# Altium footprint library kalios.PcbLib: 404 footprints (part 4 of 26)
Each footprint in its own frame and in the unit in brackets; x right, y up, seen from the top. Pads: shape width x height; smd on the part's side, far side on the other; paste and mask are expansions set on the pad; w line width, h text height; cw(c..) or ccw(c..) is an arc to the next point about the centre after c.
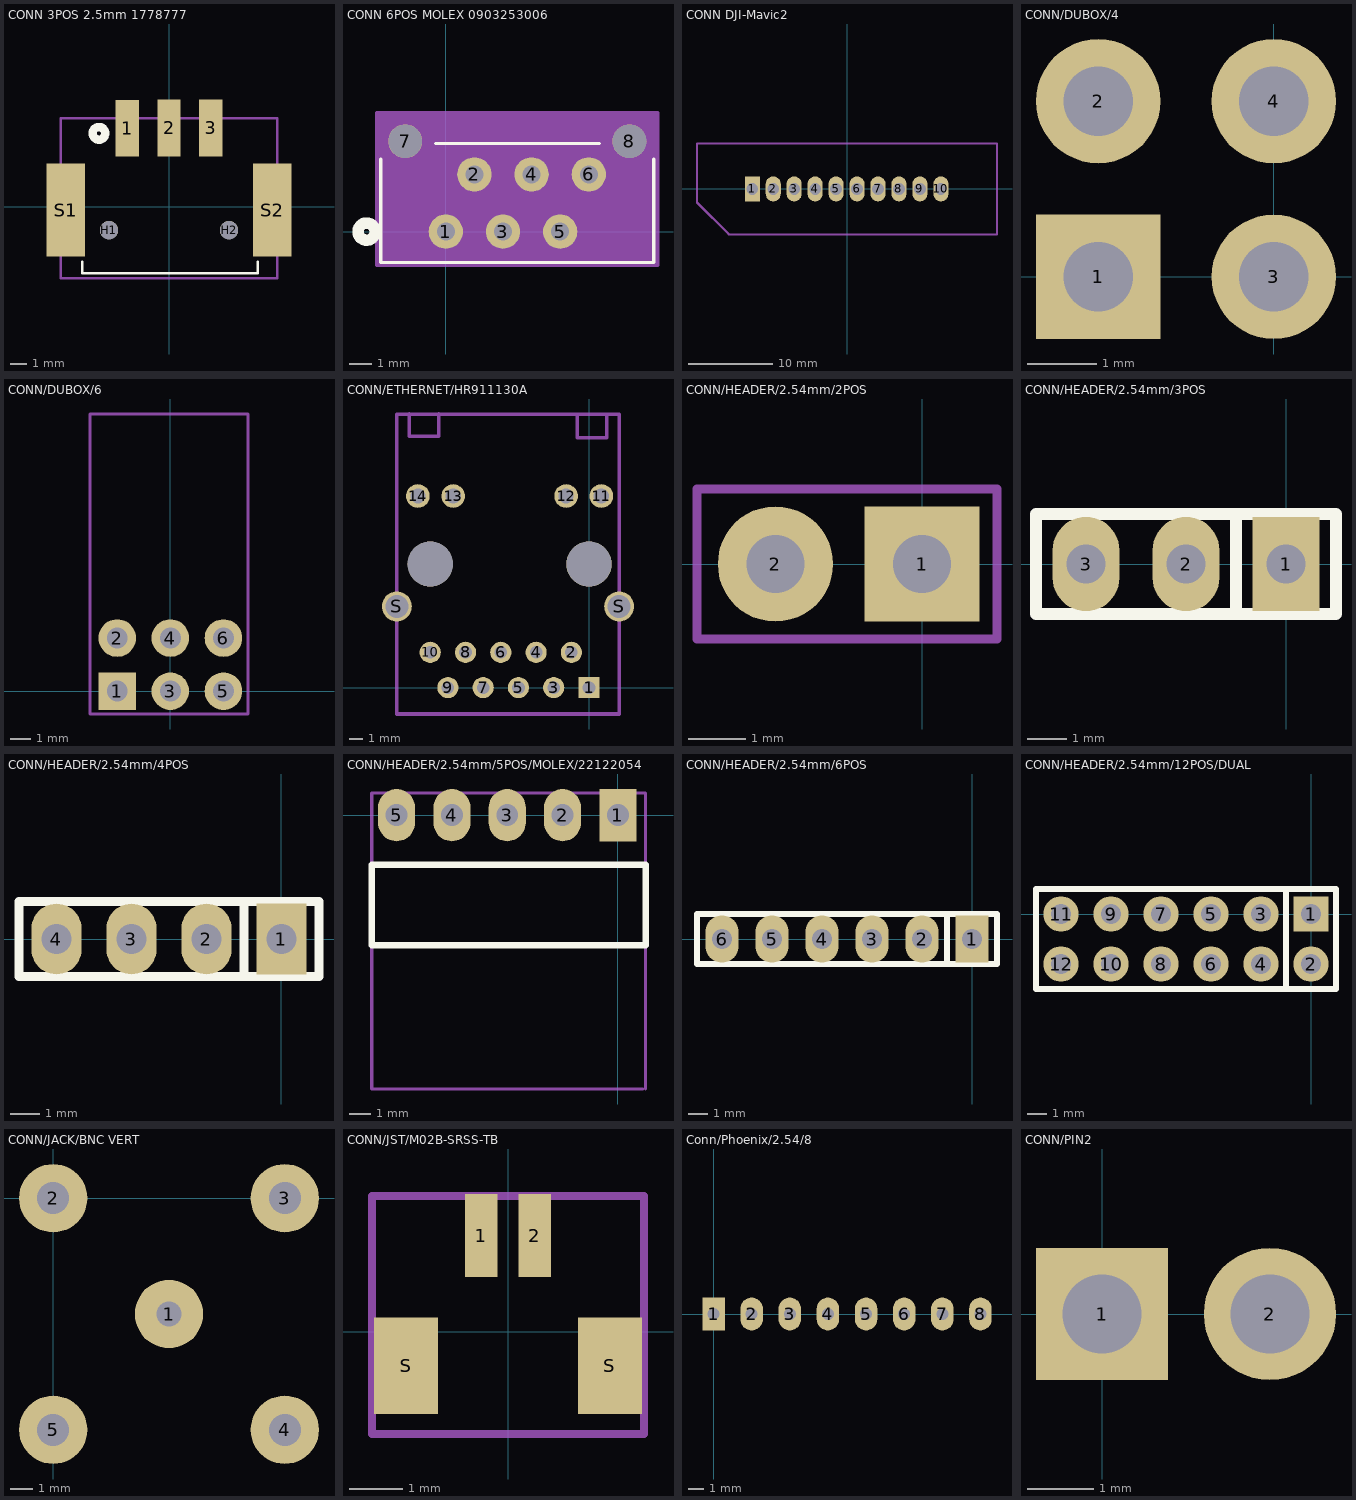
[diagram p3: the footprints below, top view; thin cyan lines are the x and y axes]

## CONN 3POS 2.5mm 1778777 [mm] "PTSM 0,5/ 3-HH-2,5-SMD R32"
pads (7):
  rect 1.397x3.404 smd paste+0 mask+0: 1(-2.5,4.7) 2(0,4.725) 3(2.5,4.725)
  round 1.1 hole 1.1 unplated: H1(-3.6,-1.4) H2(3.6,-1.4)
  rect 2.311x5.588 smd: S1(-6.2,-0.2) S2(6.2,-0.2)
Top Overlay:
  circle w0.508: c-4.2,4.4 r0.381
  lines w0.152: -5.207,-3.302 -5.207,-4 5.334,-4 5.334,-3.302
Top Courtyard:
  lines w0.152: -6.5,-4.3 6.5,-4.3 6.5,5.3 -6.5,5.3 -6.5,-4.3
Top Designator:
  text ".Designator" at -7.618,0.518 h1.52
3D body "pxc_1778777_01_PTSM-0-5-3-HH-2-5-SMD-R32_3D.stp": height 5, standoff -0.7, extent -6.55,-4.3 6.55,5.2

## CONN 6POS MOLEX 0903253006 [mil] "CONN HEADER VERT 6POS 1.27MM"
pads (8):
  round 60 hole 31.5 mask+0: 1(0,0) 2(50,100) 3(100,0) 4(150,100) 5(200,0) 6(250,100)
  round 59.06 hole 59.06 unplated: 7(-71,158) 8(321,158)
Top Overlay:
  circle w20: c-138.5,0 r15
  lines w6: -113.5,126.17 -113.5,-54 363.5,-54 363.5,126.17 ; -18.05,154 268.05,154
Bottom Overlay:
  circle w20: c-138.5,0 r15
Top 3D Body:
  circle w20: c0,75 r15
  lines w1: -108.5,-49 358.5,-49 358.5,149 -108.5,149 -108.5,-49
Top Courtyard:
  region: 371,208 -121,208 -121,-59 371,-59
  lines w6: -121,-59 -121,208 371,208 371,-59 -121,-59
Top Designator:
  text ".Designator" at -194.65,54.51 h60
3D body: height 10, standoff 0, extent 0,0 10,10
3D body "903253006.STEP": height 251.97, standoff -129.92, extent -106.93,-60 360,187.23

## CONN DJI-Mavic2 [mm]
pads (10):
  rect 1.8x3 hole 1.4 mask+0.1: 1(-11.3,0)
  oval 1.8x3 hole 1.4 mask+0.1: 2(-8.8,0) 3(-6.3,0) 4(-3.8,0) 5(-1.3,0) 6(1.2,0) 7(3.7,0) 8(6.2,0) 9(8.7,0) 10(11.2,0)
Top Assembly (Mech11):
  text ".designator" at -13.6,-4.9 h1
Top 3D Body:
  lines w0.2: -17.9,-1.55 -14,-5.45 17.9,-5.45 17.9,5.425 -17.9,5.425 -17.9,-1.55
Top Courtyard:
  lines w0.2: -17.9,-1.7 -14.15,-5.45 17.9,-5.45 17.9,5.425 -17.9,5.425 -17.9,-1.7
Top Designator:
  text ".Designator" at -7.318,-3.508 h1.52
3D body "MSD-DB05M-10P.STEP": height 7.5, standoff -3.5, extent -17.875,-5.325 17.925,5.375

## CONN/DUBOX/4 [mm]
pads (4):
  rect 1.8x1.8 hole 1: 1(-2.54,0)
  round 1.8 hole 1: 2(-2.54,2.54) 3(0,0) 4(0,2.54)
Top Designator:
  text ".Designator" at -8.938,9.13 h1.52
3D body "Dubox1.STEP": height 7.87, standoff -3.51, extent -3.821,-0.33 1.179,20.278

## CONN/DUBOX/6 [mm]
pads (6):
  rect 1.8x1.8 hole 1: 1(-2.54,0)
  round 1.8 hole 1: 2(-2.54,2.54) 3(0,0) 4(0,2.54) 5(2.54,0) 6(2.54,2.54)
Top Courtyard:
  lines w0.15: -3.835,-1.092 3.708,-1.092 3.708,13.259 -3.835,13.259 -3.835,-1.092
Top Designator:
  text ".Designator" at -7.681,5.575 h1.52
3D body "76383-403LFc.STEP": height 7.83, standoff -3.55, extent -3.822,-0.343 3.708,13.246

## CONN/ETHERNET/HR911130A [mil]
pads (18):
  rect 60x60 hole 35.83: 1(0,0)
  round 60 hole 35.83: 2(-50,100) 3(-100,0) 4(-150,100) 5(-200,0) 6(-250,100) 7(-300,0) 8(-350,100) 9(-400,0) 10(-450,100)
  round 66.93 hole 43.31: 11(35,543) 12(-65,543) 13(-385,543) 14(-485,543)
  round 85 hole 65: S(-544.63,230.14) S(85.37,230.14)
  round 127.95 hole 127.95 unplated: ""(-450,350) ""(0,350)
Top Courtyard:
  lines w10: -509.16,775.44 -509.16,712.44 -426.48,712.44 -426.48,743.94 -426.48,775.44 ; -32.81,771.5 -32.81,708.5 49.87,708.5 49.87,740 49.87,771.5 ; -544.63,-74.76 -544.63,775.24 85.37,775.24 85.37,-74.76 -544.63,-74.76
Top Designator:
  text ".Designator" at -529.53,330.35 h60
3D body "User Library-HR911130A.STEP": height 531.5, standoff -118.11, extent -537.2,-62.26 88,780.26

## CONN/HEADER/2.54mm/2POS [mm]
pads (2):
  rect 2x2 hole 1: 1(0,0)
  round 2 hole 1: 2(-2.54,0)
Top Courtyard:
  lines w0.15: -3.9,-1.3 1.3,-1.3 1.3,1.3 -3.9,1.3 -3.9,-1.3
Top Designator:
  text ".Designator" at -4.799,1.867 h0.7
3D body "99887.STEP": height 8.38, standoff -2.54, extent -3.937,-1.27 1.27,1.27

## CONN/HEADER/2.54mm/3POS [mm]
pads (3):
  rect 1.7x2.4 hole 1: 1(0,0)
  oval 1.7x2.4 hole 1: 2(-2.54,0) 3(-5.08,0)
Top Overlay:
  lines w0.3: -1.27,-1.27 -1.27,1.27 ; -6.35,-1.27 -6.35,1.27 1.27,1.27 1.27,-1.27 -6.35,-1.27
Top Courtyard:
  lines w0.15: -6.35,-1.27 -1.27,-1.27 1.27,-1.27 1.27,1.27 -6.35,1.27 -6.35,-1.27
Top Designator:
  text ".Designator" at -10.158,-0.508 h1.52
3D body "21312.STEP": height 8.38, standoff -2.54, extent -6.477,-1.27 1.27,1.27

## CONN/HEADER/2.54mm/4POS [mm]
pads (4):
  rect 1.7x2.4 hole 1: 1(0,0)
  oval 1.7x2.4 hole 1: 2(-2.54,0) 3(-5.08,0) 4(-7.62,0)
Top Overlay:
  lines w0.3: -1.27,-1.27 -1.27,1.27 ; -8.89,-1.27 1.27,-1.27 1.27,1.27 -8.89,1.27 -8.89,-1.27
Top Designator:
  text ".Designator" at -11.428,-0.508 h1.52
3D body "TSW_109_07_G_S.STEP": height 8.38, standoff -2.54, extent -9.017,-1.295 1.27,1.245

## CONN/HEADER/2.54mm/5POS/MOLEX/22122054 [mm]
pads (5):
  rect 1.7x2.4 hole 1: 1(0,0)
  oval 1.7x2.4 hole 1: 2(-2.54,0) 3(-5.08,0) 4(-7.62,0) 5(-10.16,0)
Top Overlay:
  lines w0.3: -11.303,-5.969 1.27,-5.969 1.27,-2.286 -11.303,-2.286 -11.303,-5.969
Top Courtyard:
  lines w0.15: -9.422,-12.573 -10.676,-12.573 -11.303,-12.573 -11.303,1.016 1.27,1.016 1.27,-12.573 ; -9.398,-12.573 1.143,-12.573
Top Designator:
  text ".Designator" at -12.634,-6.181 h1.52
3D body "22122054.STEP": height 6.43, standoff -3.51, extent -11.354,-12.611 1.194,0.318

## CONN/HEADER/2.54mm/6POS [mm]
pads (6):
  rect 1.7x2.4 hole 1: 1(0,0)
  oval 1.7x2.4 hole 1: 2(-2.54,0) 3(-5.08,0) 4(-7.62,0) 5(-10.16,0) 6(-12.7,0)
Top Overlay:
  lines w0.3: -1.27,-1.27 -1.27,1.27 ; -13.97,-1.27 -13.97,1.27 1.27,1.27 1.27,-1.27 -13.97,-1.27
Top Courtyard:
  lines w0.15: -13.97,-1.27 -1.27,-1.27 1.27,-1.27 1.27,1.27 -13.97,1.27 -13.97,-1.27
Top Designator:
  text ".Designator" at -13.968,-0.508 h1.52
3D body "TSW-106-07-X-S.STEP": height 2.54, standoff -8.38, extent -13.995,-1.27 1.245,1.27

## CONN/HEADER/2.54mm/12POS/DUAL [mm]
pads (12):
  rect 1.8x1.8 hole 1: 1(0,0)
  round 1.8 hole 1: 2(0,-2.54) 3(-2.54,0) 4(-2.54,-2.54) 5(-5.08,0) 6(-5.08,-2.54) 7(-7.62,0) 8(-7.62,-2.54) 9(-10.16,0) 10(-10.16,-2.54) 11(-12.7,0) 12(-12.7,-2.54)
Top Overlay:
  lines w0.3: -1.27,-3.81 -1.27,1.27 ; -13.97,-3.81 -13.97,1.27 1.27,1.27 1.27,-3.81 -13.97,-3.81
Top Designator:
  text ".Designator" at -13.968,-2.258 h1.52
3D body "825440-6.STEP": height 2.8, standoff -9.9, extent -13.97,-4.92 1.27,1.23

## CONN/JACK/BNC VERT [mm]
pads (5):
  round 3 hole 1.1: 1(5.08,-5.08)
  round 3 hole 1.4: 2(0,0) 3(10.16,0) 4(10.16,-10.16) 5(0,-10.16)
Top Designator:
  text ".Designator" at -2.537,-5.588 h1.52
3D body "C-5227699-02-3.STEP": height 18.4, standoff -6.31, extent -3.645,-13.805 13.805,3.645

## CONN/JST/M02B-SRSS-TB [mm]
pads (4):
  rect 0.6x1.55 smd: 1(-0.5,1.8) 2(0.5,1.8)
  rect 1.2x1.8 smd: S(-1.905,-0.635) S(1.905,-0.635)
Top Courtyard:
  lines w0.15: -2.54,-1.905 2.54,-1.905 2.54,2.54 -2.54,2.54 -2.54,-1.905
Top Designator:
  text ".Designator" at -7.618,-0.16 h1.52
3D body "BM02B-SRSS-TB.STEP": height 4.25, standoff -0.07, extent -2,-1.45 2,2.15

## Conn/Phoenix/2.54/8 [mm]
pads (8):
  rect 1.5x2.2 hole 0.8 unplated: 1(0,0)
  oval 1.5x2.2 hole 0.8 unplated: 2(2.54,0) 3(5.08,0) 4(7.62,0) 5(10.16,0) 6(12.7,0) 7(15.24,0) 8(17.78,0)
Top Designator:
  text ".Designator" at 1.488,-0.368 h1.52
3D body "User Library-Connector-8.STEP": height 8.64, standoff -1.91, extent -1.245,-2.972 19.456,3.251

## CONN/PIN2 [mm]
pads (2):
  rect 2x2 hole 1.2 unplated: 1(0,0)
  round 2 hole 1.2 unplated: 2(2.54,0)
Top Designator:
  text ".Designator" at -6.348,-0.508 h1.52